# Altium schematic symbol library LATTICEPLDS_Library.SchLib: 291 symbols (part 28 of 32) (continued)
## LFXP2-5E-T144/TN144 (continued)
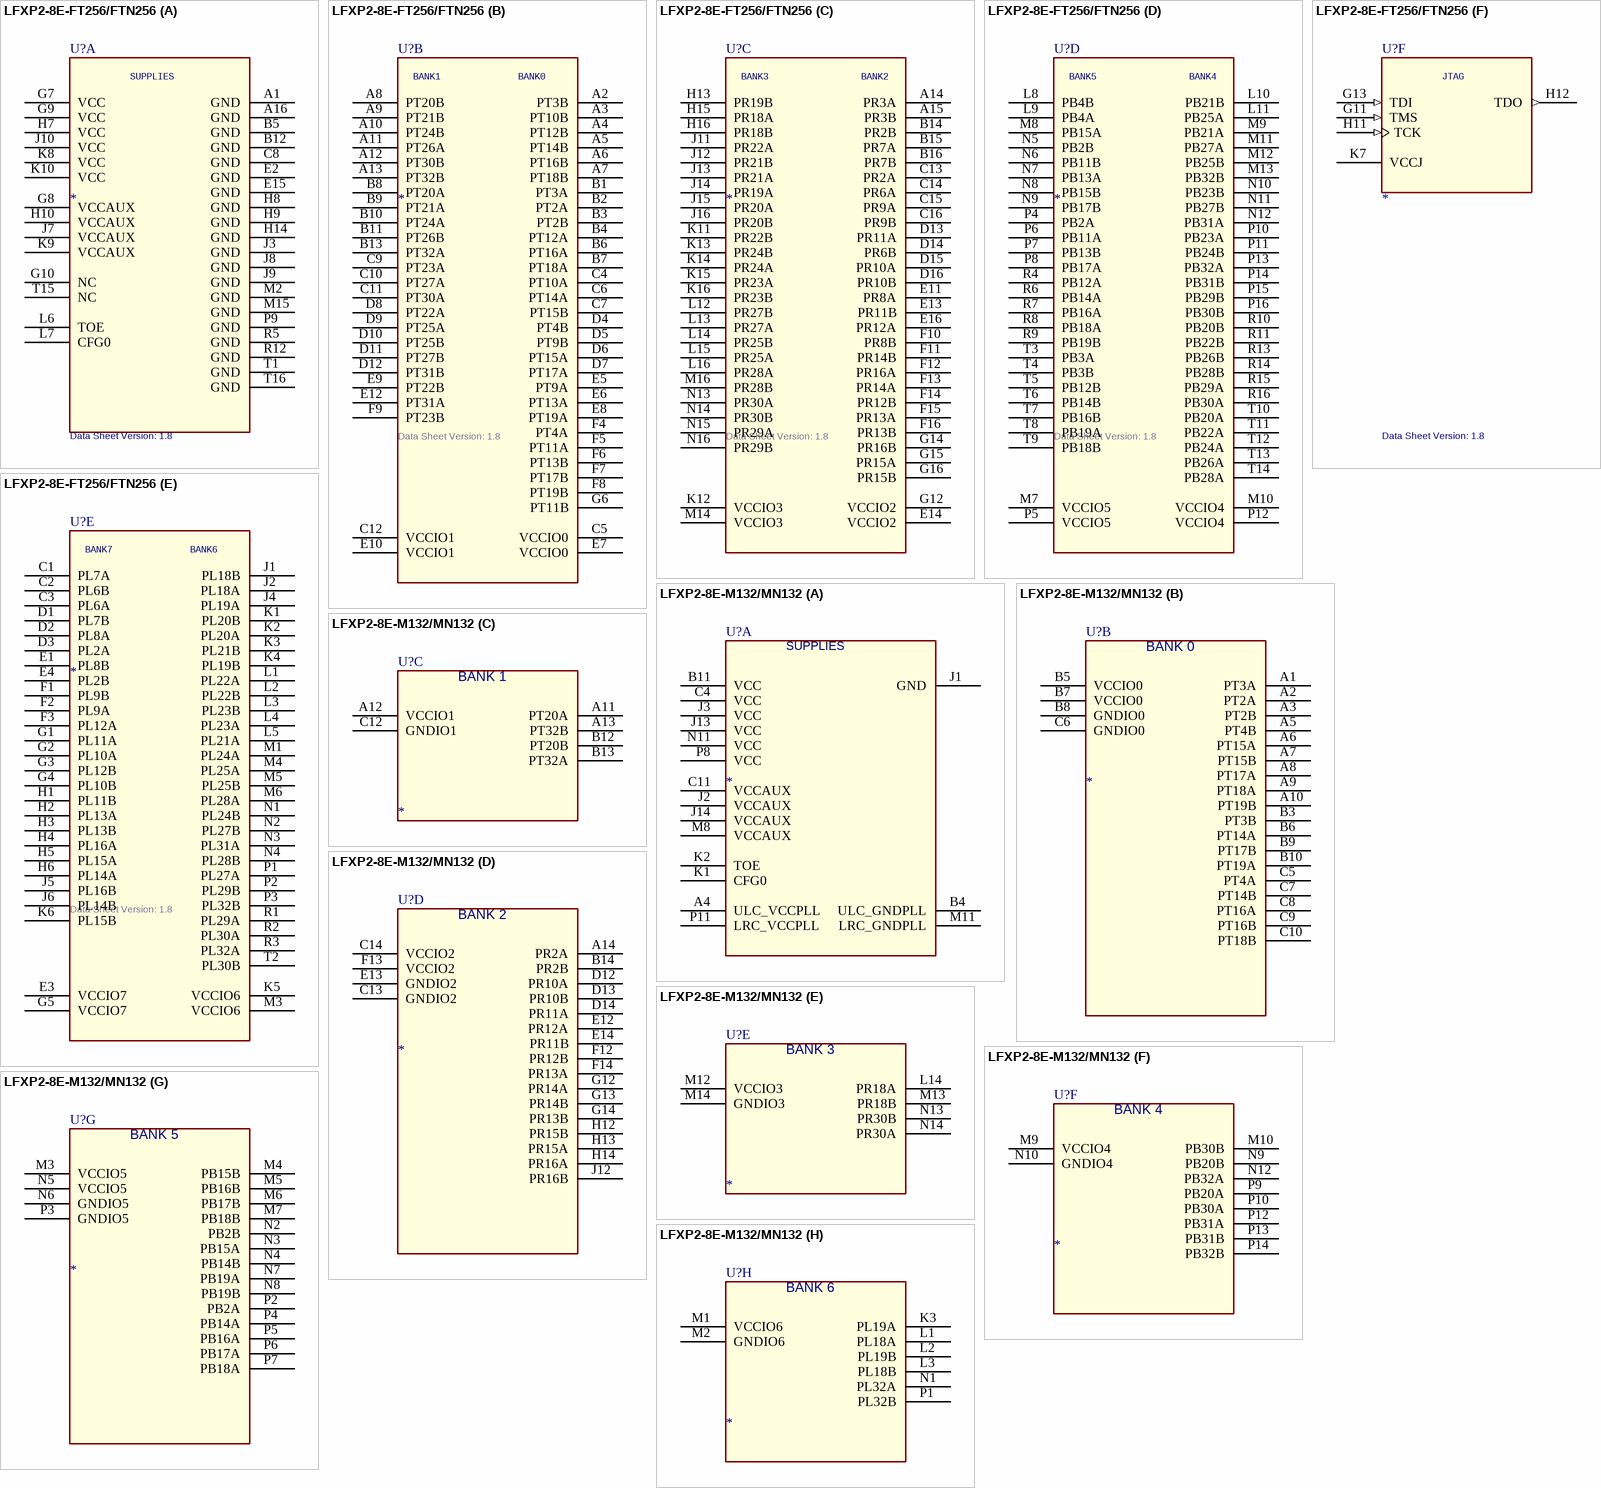
[diagram p252: symbols LFXP2-8E-FT256/FTN256 to LFXP2-8E-M132/MN132]
part B text: BANK 1; BANK 0
part C text: BANK 3; BANK 2
part D text: BANK 5; BANK 4
part E text: BANK 7; BANK 6
part F text: JTAG

## LFXP2-8E-FT256/FTN256
designator U?  Data Sheet Version: 1.8
SWAP_INFO: (S1+S2+S3+S4+S5+S6); SPLIT_INST: TRUE
part A pins: A1 GND (power), A16 GND (power), B5 GND (power), B12 GND (power), C8 GND (power), E2 GND (power), E15 GND (power), G7 VCC (power), G8 VCCAUX (power), G9 VCC (power), G10 NC, H7 VCC (power), H8 GND (power), H9 GND (power), H10 VCCAUX (power), H14 GND (power), J3 GND (power), J7 VCCAUX (power), J8 GND (power), J9 GND (power), J10 VCC (power), K8 VCC (power), K9 VCCAUX (power), K10 VCC (power), L6 TOE, L7 CFG0, M2 GND (power), M15 GND (power), P9 GND (power), R5 GND (power), R12 GND (power), T1 GND (power), T15 NC, T16 GND (power)
part B pins: A2 PT3B, A3 PT10B, A4 PT12B, A5 PT14B, A6 PT16B, A7 PT18B, A8 PT20B, A9 PT21B, A10 PT24B, A11 PT26A, A12 PT30B, A13 PT32B, B1 PT3A, B2 PT2A, B3 PT2B, B4 PT12A, B6 PT16A, B7 PT18A, B8 PT20A, B9 PT21A, B10 PT24A, B11 PT26B, B13 PT32A, C4 PT10A, C5 VCCIO0, C6 PT14A, C7 PT15B, C9 PT23A, C10 PT27A, C11 PT30A, C12 VCCIO1, D4 PT4B, D5 PT9B, D6 PT15A, D7 PT17A, D8 PT22A, D9 PT25A, D10 PT25B, D11 PT27B, D12 PT31B, E5 PT9A, E6 PT13A, E7 VCCIO0, E8 PT19A, E9 PT22B, E10 VCCIO1, E12 PT31A, F4 PT4A, F5 PT11A, F6 PT13B, F7 PT17B, F8 PT19B, F9 PT23B, G6 PT11B
part C pins: A14 PR3A, A15 PR3B, B14 PR2B, B15 PR7A, B16 PR7B, C13 PR2A, C14 PR6A, C15 PR9A, C16 PR9B, D13 PR11A, D14 PR6B, D15 PR10A, D16 PR10B, E11 PR8A, E13 PR11B, E14 VCCIO2, E16 PR12A, F10 PR8B, F11 PR14B, F12 PR16A, F13 PR14A, F14 PR12B, F15 PR13A, F16 PR13B, G12 VCCIO2, G14 PR16B, G15 PR15A, G16 PR15B, H13 PR19B, H15 PR18A, H16 PR18B, J11 PR22A, J12 PR21B, J13 PR21A, J14 PR19A, J15 PR20A, J16 PR20B, K11 PR22B, K12 VCCIO3, K13 PR24B, K14 PR24A, K15 PR23A, K16 PR23B, L12 PR27B, L13 PR27A, L14 PR25B, L15 PR25A, L16 PR28A, M14 VCCIO3, M16 PR28B, N13 PR30A, N14 PR30B, N15 PR29A, N16 PR29B
part D pins: L8 PB4B, L9 PB4A, L10 PB21B, L11 PB25A, M7 VCCIO5, M8 PB15A, M9 PB21A, M10 VCCIO4, M11 PB27A, M12 PB25B, M13 PB32B, N5 PB2B, N6 PB11B, N7 PB13A, N8 PB15B, N9 PB17B, N10 PB23B, N11 PB27B, N12 PB31A, P4 PB2A, P5 VCCIO5, P6 PB11A, P7 PB13B, P8 PB17A, P10 PB23A, P11 PB24B, P12 VCCIO4, P13 PB32A, P14 PB31B, P15 PB29B, P16 PB30B, R4 PB12A, R6 PB14A, R7 PB16A, R8 PB18A, R9 PB19B, R10 PB20B, R11 PB22B, R13 PB26B, R14 PB28B, R15 PB29A, R16 PB30A, T3 PB3A, T4 PB3B, T5 PB12B, T6 PB14B, T7 PB16B, T8 PB19A, T9 PB18B, T10 PB20A, T11 PB22A, T12 PB24A, T13 PB26A, T14 PB28A
part E pins: C1 PL7A, C2 PL6B, C3 PL6A, D1 PL7B, D2 PL8A, D3 PL2A, E1 PL8B, E3 VCCIO7, E4 PL2B, F1 PL9B, F2 PL9A, F3 PL12A, G1 PL11A, G2 PL10A, G3 PL12B, G4 PL10B, G5 VCCIO7, H1 PL11B, H2 PL13A, H3 PL13B, H4 PL16A, H5 PL15A, H6 PL14A, J1 PL18B, J2 PL18A, J4 PL19A, J5 PL16B, J6 PL14B, K1 PL20B, K2 PL20A, K3 PL21B, K4 PL19B, K5 VCCIO6, K6 PL15B, L1 PL22A, L2 PL22B, L3 PL23B, L4 PL23A, L5 PL21A, M1 PL24A, M3 VCCIO6, M4 PL25A, M5 PL25B, M6 PL28A, N1 PL24B, N2 PL27B, N3 PL31A, N4 PL28B, P1 PL27A, P2 PL29B, P3 PL32B, R1 PL29A, R2 PL30A, R3 PL32A, T2 PL30B
part F pins: G11 TMS (in), G13 TDI (in), H11 TCK (in), H12 TDO (out), K7 VCCJ (power)
part A text: SUPPLIES
part B text: BANK1; BANK0
part C text: BANK3; BANK2
part D text: BANK5; BANK4
part E text: BANK7; BANK6
part F text: JTAG

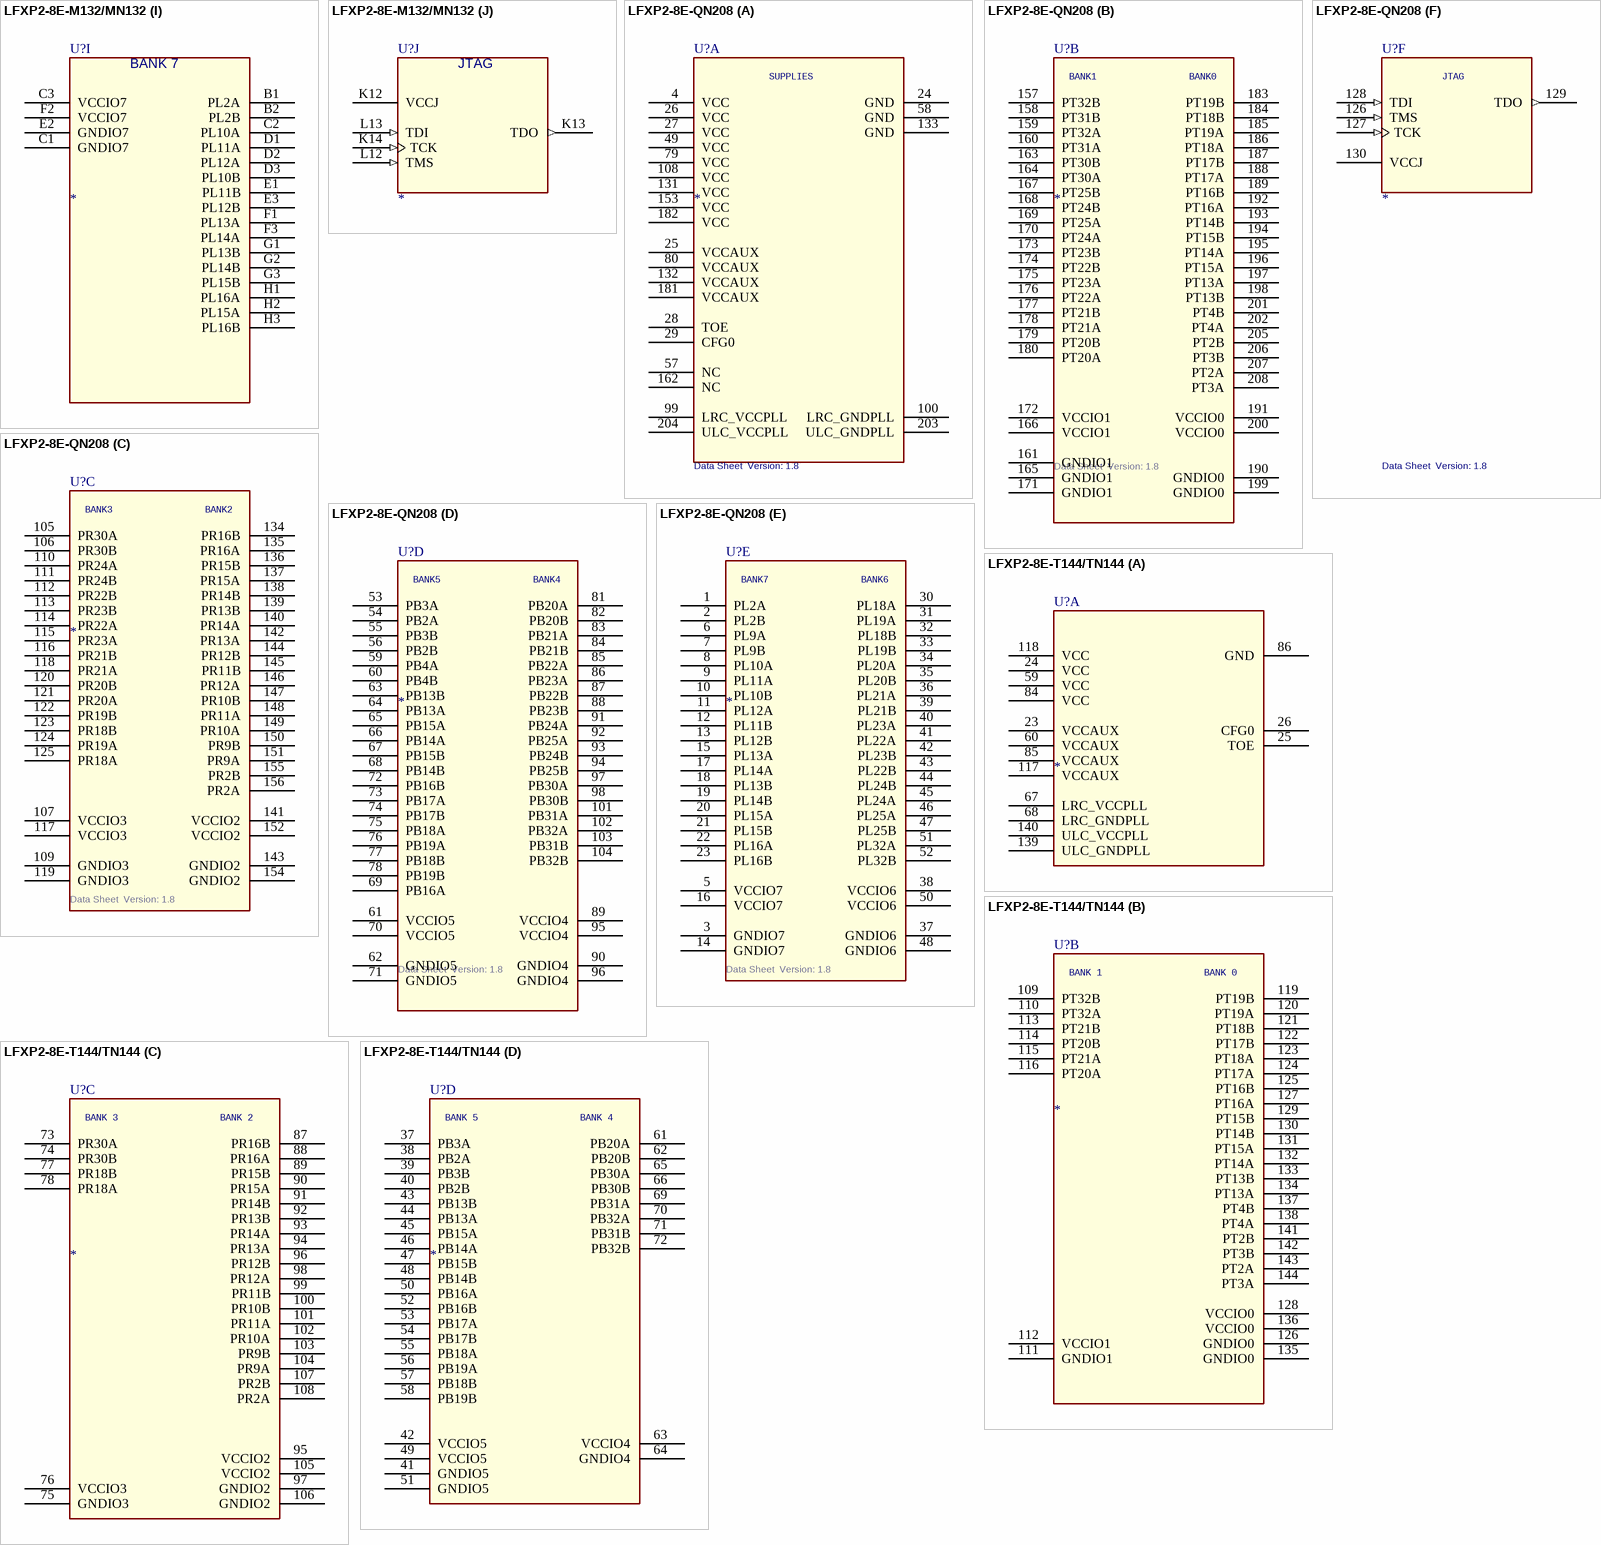
[diagram p253: symbols LFXP2-8E-M132/MN132 to LFXP2-8E-T144/TN144]

## LFXP2-8E-M132/MN132
designator U?
SPLIT_INST: TRUE; SWAP_INFO: (S1+S2+S3+S4+S5+S6+S7+S8+S9+S10)
part A pins: A4 ULC_VCCPLL (power), B4 ULC_GNDPLL (power), B11 VCC (power), C4 VCC (power), C11 VCCAUX (power), J1 GND (power), J2 VCCAUX (power), J3 VCC (power), J13 VCC (power), J14 VCCAUX (power), K1 CFG0, K2 TOE, M8 VCCAUX (power), M11 LRC_GNDPLL (power), N11 VCC (power), P8 VCC (power), P11 LRC_VCCPLL (power)
part B pins: A1 PT3A, A2 PT2A, A3 PT2B, A5 PT4B, A6 PT15A, A7 PT15B, A8 PT17A, A9 PT18A, A10 PT19B, B3 PT3B, B5 VCCIO0 (power), B6 PT14A, B7 VCCIO0 (power), B8 GNDIO0 (power), B9 PT17B, B10 PT19A, C5 PT4A, C6 GNDIO0 (power), C7 PT14B, C8 PT16A, C9 PT16B, C10 PT18B
part C pins: A11 PT20A, A12 VCCIO1 (power), A13 PT32B, B12 PT20B, B13 PT32A, C12 GNDIO1 (power)
part D pins: A14 PR2A, B14 PR2B, C13 GNDIO2 (power), C14 VCCIO2 (power), D12 PR10A, D13 PR10B, D14 PR11A, E12 PR12A, E13 GNDIO2 (power), E14 PR11B, F12 PR12B, F13 VCCIO2 (power), F14 PR13A, G12 PR14A, G13 PR14B, G14 PR13B, H12 PR15B, H13 PR15A, H14 PR16A, J12 PR16B
part E pins: L14 PR18A, M12 VCCIO3 (power), M13 PR18B, M14 GNDIO3 (power), N13 PR30B, N14 PR30A
part F pins: M9 VCCIO4 (power), M10 PB30B, N9 PB20B, N10 GNDIO4 (power), N12 PB32A, P9 PB20A, P10 PB30A, P12 PB31A, P13 PB31B, P14 PB32B
part G pins: M3 VCCIO5 (power), M4 PB15B, M5 PB16B, M6 PB17B, M7 PB18B, N2 PB2B, N3 PB15A, N4 PB14B, N5 VCCIO5 (power), N6 GNDIO5 (power), N7 PB19A, N8 PB19B, P2 PB2A, P3 GNDIO5 (power), P4 PB14A, P5 PB16A, P6 PB17A, P7 PB18A
part H pins: K3 PL19A, L1 PL18A, L2 PL19B, L3 PL18B, M1 VCCIO6 (power), M2 GNDIO6 (power), N1 PL32A, P1 PL32B
part I pins: B1 PL2A, B2 PL2B, C1 GNDIO7 (power), C2 PL10A, C3 VCCIO7 (power), D1 PL11A, D2 PL12A, D3 PL10B, E1 PL11B, E2 GNDIO7 (power), E3 PL12B, F1 PL13A, F2 VCCIO7 (power), F3 PL14A, G1 PL13B, G2 PL14B, G3 PL15B, H1 PL16A, H2 PL15A, H3 PL16B
part J pins: K12 VCCJ (power), K13 TDO (out), K14 TCK (in), L12 TMS (in), L13 TDI (in)
part A text: SUPPLIES
part B text: BANK 0
part C text: BANK 1
part D text: BANK 2
part E text: BANK 3
part F text: BANK 4
part G text: BANK 5
part H text: BANK 6
part I text: BANK 7
part J text: JTAG

## LFXP2-8E-QN208
designator U?  Data Sheet  Version: 1.8
SPLIT_INST: TRUE; SWAP_INFO: (S1+S2+S3+S4+S5+S6)
part A pins: 4 VCC (power), 24 GND (power), 25 VCCAUX (power), 26 VCC (power), 27 VCC (power), 28 TOE, 29 CFG0, 49 VCC (power), 57 NC, 58 GND (power), 79 VCC (power), 80 VCCAUX (power), 99 LRC_VCCPLL (power), 100 LRC_GNDPLL (power), 108 VCC (power), 131 VCC (power), 132 VCCAUX (power), 133 GND (power), 153 VCC (power), 162 NC, 181 VCCAUX (power), 182 VCC (power), 203 ULC_GNDPLL (power), 204 ULC_VCCPLL (power)
part B pins: 157 PT32B, 158 PT31B, 159 PT32A, 160 PT31A, 161 GNDIO1 (power), 163 PT30B, 164 PT30A, 165 GNDIO1 (power), 166 VCCIO1, 167 PT25B, 168 PT24B, 169 PT25A, 170 PT24A, 171 GNDIO1 (power), 172 VCCIO1, 173 PT23B, 174 PT22B, 175 PT23A, 176 PT22A, 177 PT21B, 178 PT21A, 179 PT20B, 180 PT20A, 183 PT19B, 184 PT18B, 185 PT19A, 186 PT18A, 187 PT17B, 188 PT17A, 189 PT16B, 190 GNDIO0 (power), 191 VCCIO0, 192 PT16A, 193 PT14B, 194 PT15B, 195 PT14A, 196 PT15A, 197 PT13A, 198 PT13B, 199 GNDIO0 (power), 200 VCCIO0, 201 PT4B, 202 PT4A, 205 PT2B, 206 PT3B, 207 PT2A, 208 PT3A
part C pins: 105 PR30A, 106 PR30B, 107 VCCIO3, 109 GNDIO3 (power), 110 PR24A, 111 PR24B, 112 PR22B, 113 PR23B, 114 PR22A, 115 PR23A, 116 PR21B, 117 VCCIO3, 118 PR21A, 119 GNDIO3 (power), 120 PR20B, 121 PR20A, 122 PR19B, 123 PR18B, 124 PR19A, 125 PR18A, 134 PR16B, 135 PR16A, 136 PR15B, 137 PR15A, 138 PR14B, 139 PR13B, 140 PR14A, 141 VCCIO2, 142 PR13A, 143 GNDIO2 (power), 144 PR12B, 145 PR11B, 146 PR12A, 147 PR10B, 148 PR11A, 149 PR10A, 150 PR9B, 151 PR9A, 152 VCCIO2, 154 GNDIO2 (power), 155 PR2B, 156 PR2A
part D pins: 53 PB3A, 54 PB2A, 55 PB3B, 56 PB2B, 59 PB4A, 60 PB4B, 61 VCCIO5, 62 GNDIO5 (power), 63 PB13B, 64 PB13A, 65 PB15A, 66 PB14A, 67 PB15B, 68 PB14B, 69 PB16A, 70 VCCIO5, 71 GNDIO5 (power), 72 PB16B, 73 PB17A, 74 PB17B, 75 PB18A, 76 PB19A, 77 PB18B, 78 PB19B, 81 PB20A, 82 PB20B, 83 PB21A, 84 PB21B, 85 PB22A, 86 PB23A, 87 PB22B, 88 PB23B, 89 VCCIO4, 90 GNDIO4 (power), 91 PB24A, 92 PB25A, 93 PB24B, 94 PB25B, 95 VCCIO4, 96 GNDIO4 (power), 97 PB30A, 98 PB30B, 101 PB31A, 102 PB32A, 103 PB31B, 104 PB32B
part E pins: 1 PL2A, 2 PL2B, 3 GNDIO7 (power), 5 VCCIO7, 6 PL9A, 7 PL9B, 8 PL10A, 9 PL11A, 10 PL10B, 11 PL12A, 12 PL11B, 13 PL12B, 14 GNDIO7 (power), 15 PL13A, 16 VCCIO7, 17 PL14A, 18 PL13B, 19 PL14B, 20 PL15A, 21 PL15B, 22 PL16A, 23 PL16B, 30 PL18A, 31 PL19A, 32 PL18B, 33 PL19B, 34 PL20A, 35 PL20B, 36 PL21A, 37 GNDIO6 (power), 38 VCCIO6, 39 PL21B, 40 PL23A, 41 PL22A, 42 PL23B, 43 PL22B, 44 PL24B, 45 PL24A, 46 PL25A, 47 PL25B, 48 GNDIO6 (power), 50 VCCIO6, 51 PL32A, 52 PL32B
part F pins: 126 TMS (in), 127 TCK (in), 128 TDI (in), 129 TDO (out), 130 VCCJ (power)
part A text: SUPPLIES
part B text: BANK1; BANK0
part C text: BANK3; BANK2
part D text: BANK5; BANK4
part E text: BANK7; BANK6
part F text: JTAG

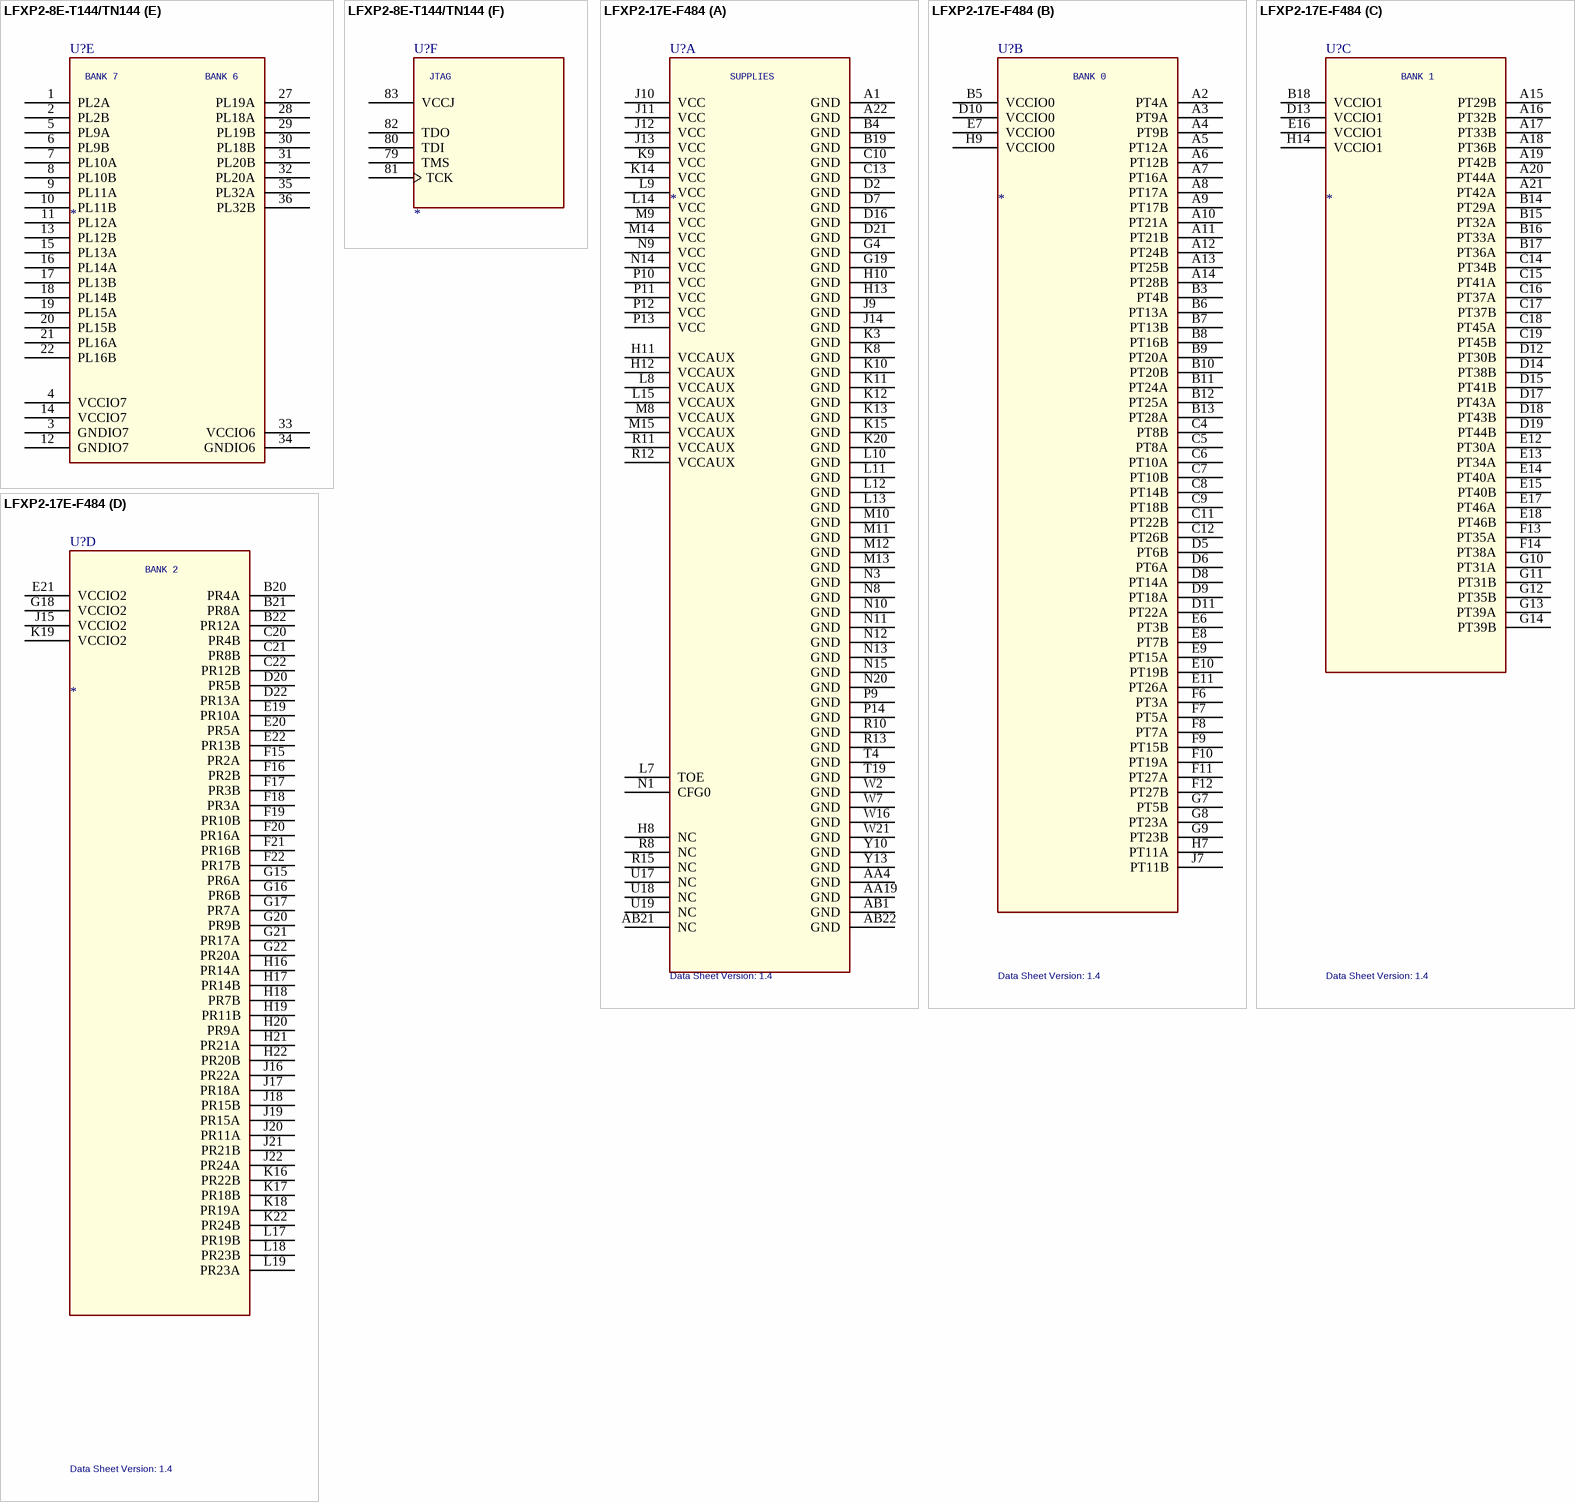
[diagram p254: symbols LFXP2-8E-T144/TN144 to LFXP2-17E-F484]

## LFXP2-8E-T144/TN144
designator U?
SPLIT_INST: TRUE; SWAP_INFO: (S1+S2+S3+S4+S5+S6)
part A pins: 23 VCCAUX (power), 24 VCC (power), 25 TOE, 26 CFG0, 59 VCC (power), 60 VCCAUX (power), 67 LRC_VCCPLL (power), 68 LRC_GNDPLL (power), 84 VCC (power), 85 VCCAUX (power), 86 GND (power), 117 VCCAUX (power), 118 VCC (power), 139 ULC_GNDPLL (power), 140 ULC_VCCPLL (power)
part B pins: 109 PT32B, 110 PT32A, 111 GNDIO1 (power), 112 VCCIO1, 113 PT21B, 114 PT20B, 115 PT21A, 116 PT20A, 119 PT19B, 120 PT19A, 121 PT18B, 122 PT17B, 123 PT18A, 124 PT17A, 125 PT16B, 126 GNDIO0 (power), 127 PT16A, 128 VCCIO0, 129 PT15B, 130 PT14B, 131 PT15A, 132 PT14A, 133 PT13B, 134 PT13A, 135 GNDIO0 (power), 136 VCCIO0, 137 PT4B, 138 PT4A, 141 PT2B, 142 PT3B, 143 PT2A, 144 PT3A
part C pins: 73 PR30A, 74 PR30B, 75 GNDIO3 (power), 76 VCCIO3, 77 PR18B, 78 PR18A, 87 PR16B, 88 PR16A, 89 PR15B, 90 PR15A, 91 PR14B, 92 PR13B, 93 PR14A, 94 PR13A, 95 VCCIO2, 96 PR12B, 97 GNDIO2 (power), 98 PR12A, 99 PR11B, 100 PR10B, 101 PR11A, 102 PR10A, 103 PR9B, 104 PR9A, 105 VCCIO2, 106 GNDIO2 (power), 107 PR2B, 108 PR2A
part D pins: 37 PB3A, 38 PB2A, 39 PB3B, 40 PB2B, 41 GNDIO5 (power), 42 VCCIO5, 43 PB13B, 44 PB13A, 45 PB15A, 46 PB14A, 47 PB15B, 48 PB14B, 49 VCCIO5, 50 PB16A, 51 GNDIO5 (power), 52 PB16B, 53 PB17A, 54 PB17B, 55 PB18A, 56 PB19A, 57 PB18B, 58 PB19B, 61 PB20A, 62 PB20B, 63 VCCIO4, 64 GNDIO4 (power), 65 PB30A, 66 PB30B, 69 PB31A, 70 PB32A, 71 PB31B, 72 PB32B
part E pins: 1 PL2A, 2 PL2B, 3 GNDIO7 (power), 4 VCCIO7, 5 PL9A, 6 PL9B, 7 PL10A, 8 PL10B, 9 PL11A, 10 PL11B, 11 PL12A, 12 GNDIO7 (power), 13 PL12B, 14 VCCIO7, 15 PL13A, 16 PL14A, 17 PL13B, 18 PL14B, 19 PL15A, 20 PL15B, 21 PL16A, 22 PL16B, 27 PL19A, 28 PL18A, 29 PL19B, 30 PL18B, 31 PL20B, 32 PL20A, 33 VCCIO6, 34 GNDIO6 (power), 35 PL32A, 36 PL32B
part F pins: 79 TMS, 80 TDI, 81 TCK, 82 TDO, 83 VCCJ

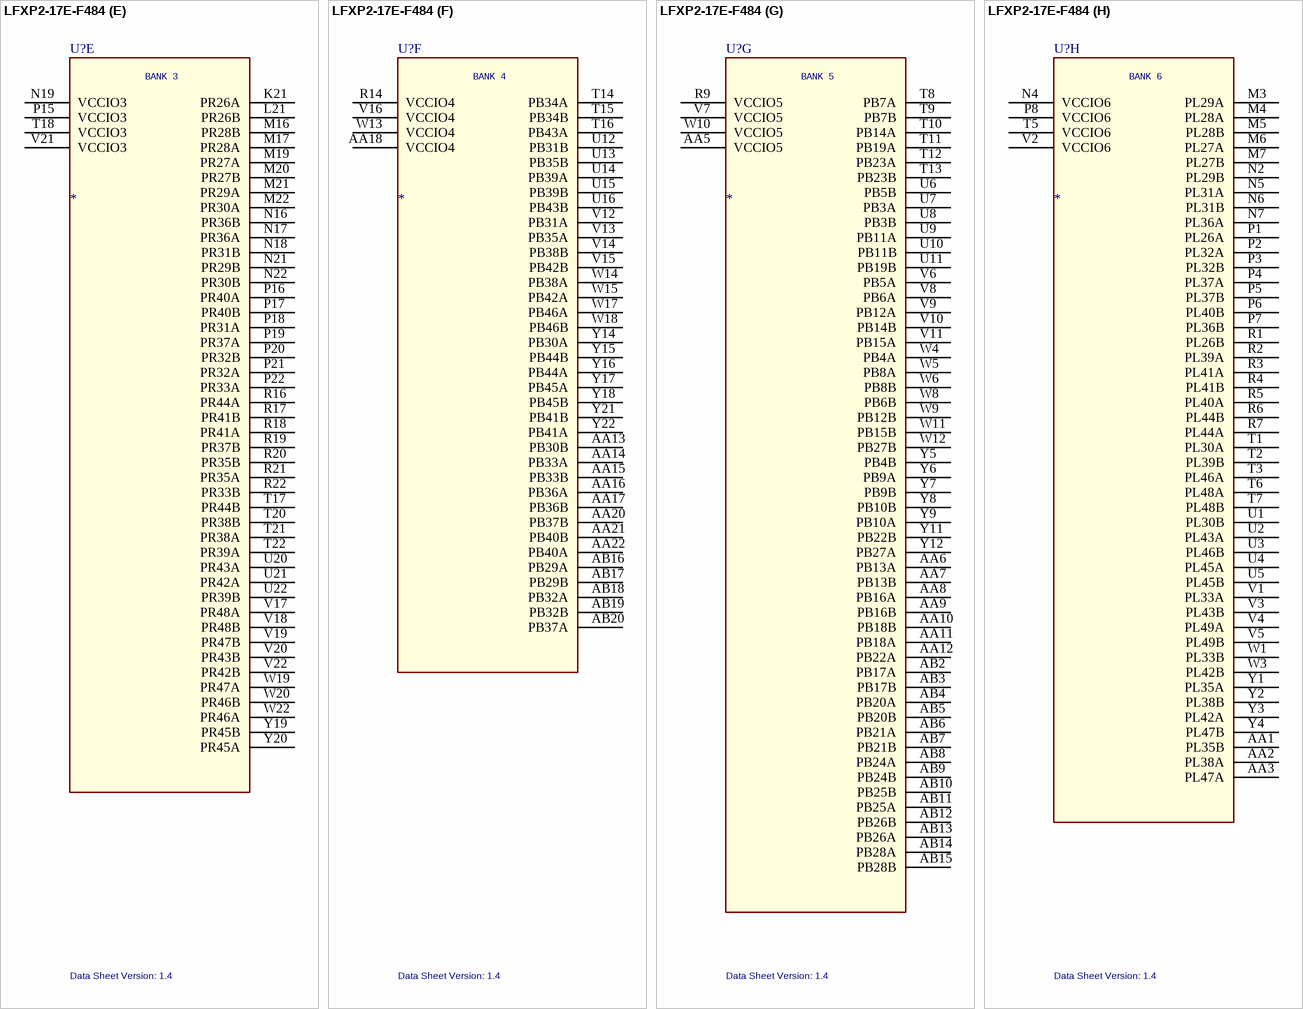
[diagram p255: symbol LFXP2-17E-F484]
